# Altium footprint library RES_TH.PcbLib: 94 footprints (part 4 of 6)
Each footprint in its own frame and in the unit in brackets; x right, y up, seen from the top. Pads: shape width x height; smd on the part's side, far side on the other; paste and mask are expansions set on the pad; w line width, h text height; cw(c..) or ccw(c..) is an arc to the next point about the centre after c.
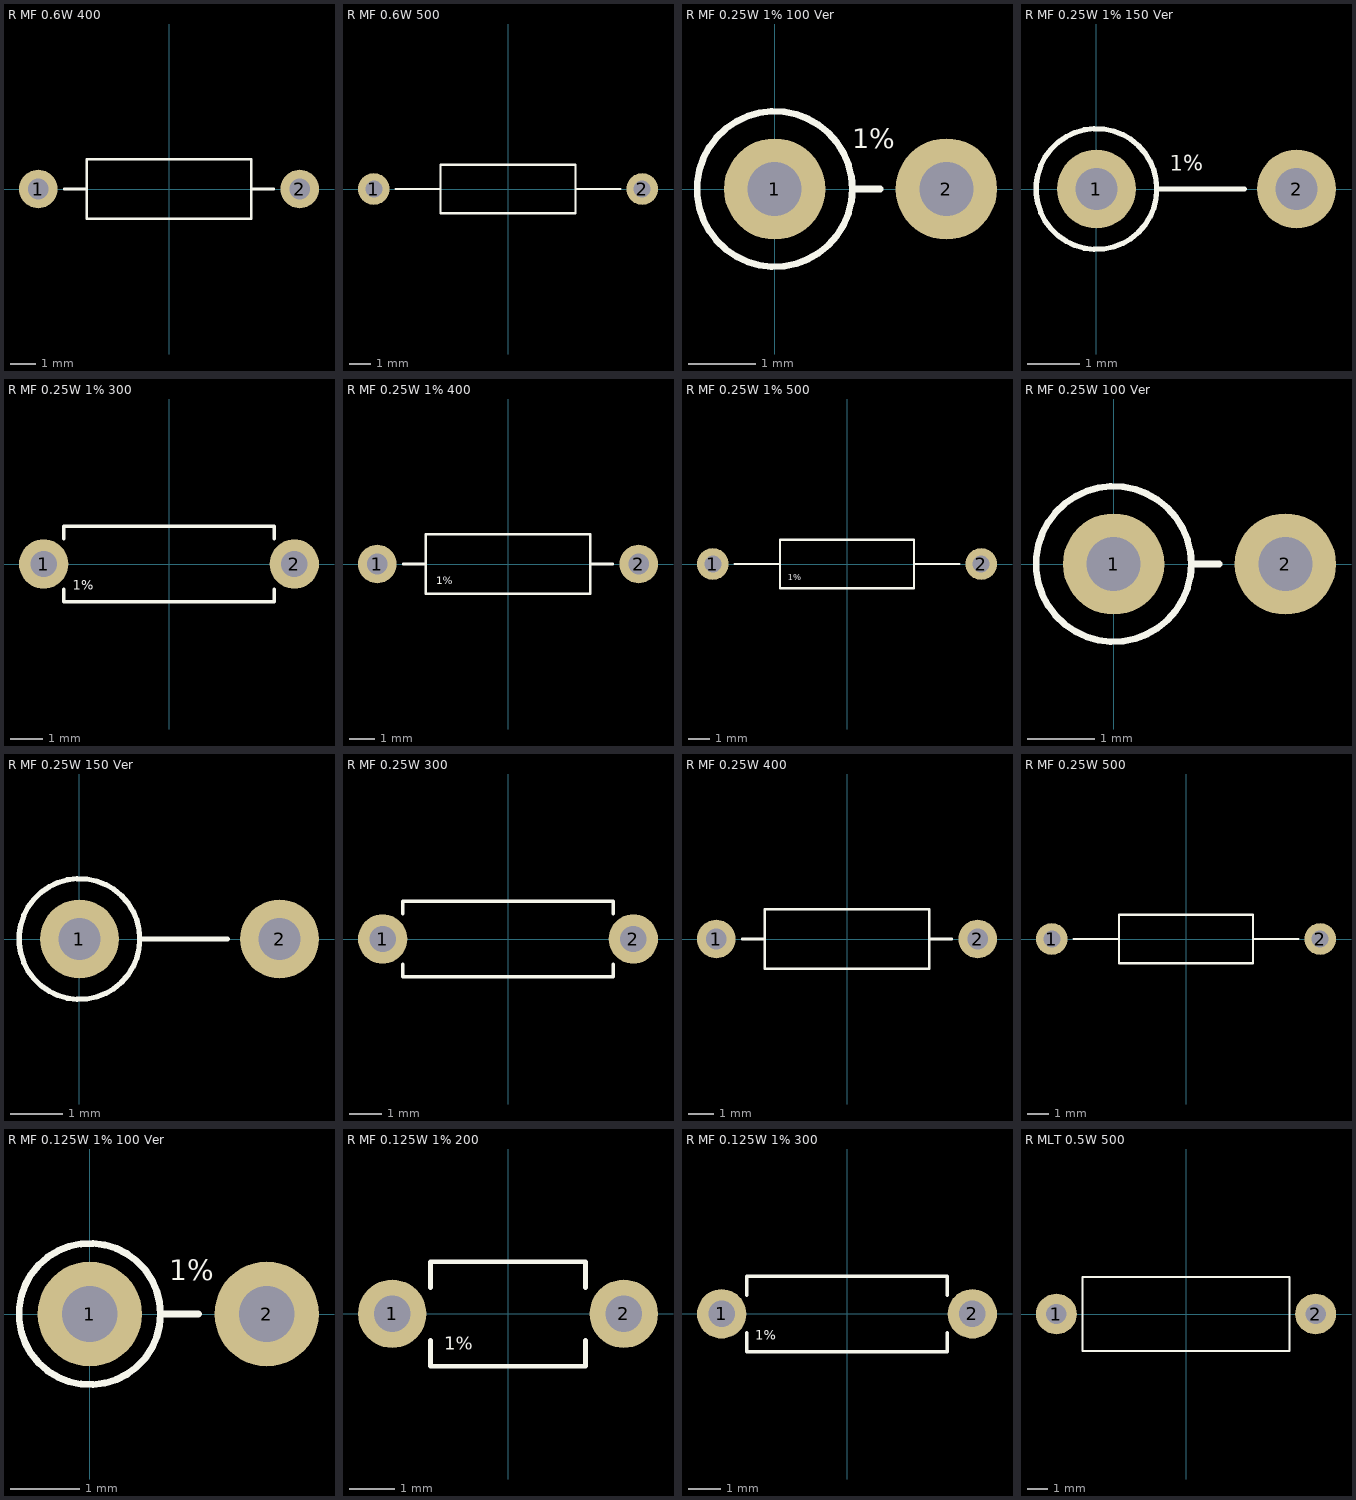
[diagram p3: the footprints below, top view; thin cyan lines are the x and y axes]

## R MF 0.6W 400 [mm]
pads (2):
  round 1.5 hole 0.8: 1(-5.08,0) 2(5.08,0)
Top Overlay:
  lines w0.1: -4.064,0 -3.2,0 ; 3.2,0 4.064,0 ; -3.2,-1.15 3.2,-1.15 3.2,1.15 -3.2,1.15 -3.2,-1.15
3D body "R0.6W 1% 400.SLDPRT": height 2.3, standoff -2.54, extent -5.378,-1.15 5.378,1.15

## R MF 0.6W 500 [mm]
pads (2):
  round 1.5 hole 0.8: 1(-6.35,0) 2(6.35,0)
Top Overlay:
  lines w0.1: -5.334,0 -3.2,0 ; 3.2,0 5.334,0 ; -3.2,-1.15 -3.2,1.15 3.2,1.15 3.2,-1.15 -3.2,-1.15
3D body "R0.6W 1% 500.SLDPRT": height 2.3, standoff -2.54, extent -6.648,-1.15 6.648,1.15

## R MF 0.25W 1% 100 Ver [mm]
pads (2):
  round 1.5 hole 0.8: 1(0,0) 2(2.54,0)
Top Overlay:
  circle w0.1: c0,0 r1.15
  lines w0.1: 1.15,0 1.562,0
  text "1%" at 1.15,0.508 h0.5
3D body "R0.25W 1% 100 Ver.SLDPRT": height 8.06, standoff -2.54, extent -1.15,-1.15 2.838,1.15

## R MF 0.25W 1% 150 Ver [mm]
pads (2):
  round 1.5 hole 0.8: 1(0,0) 2(3.81,0)
Top Overlay:
  circle w0.1: c0,0 r1.15
  lines w0.1: 1.15,0 2.812,0
  text "1%" at 1.397,0.254 h0.5
3D body "R0.25W 1% 150 Ver.SLDPRT": height 8.7, standoff -2.54, extent -1.15,-1.15 4.108,1.15

## R MF 0.25W 1% 300 [mm]
pads (2):
  round 1.5 hole 0.8: 1(-3.81,0) 2(3.81,0)
Top Overlay:
  lines w0.1: -3.2,-0.762 -3.2,-1.15 3.2,-1.15 3.2,-0.762 ; -3.2,0.762 -3.2,1.15 3.2,1.15 3.2,0.762
  text "1%" at -2.921,-0.889 h0.5
3D body "R0.25W 1% 300.SLDPRT": height 2.3, standoff -2.54, extent -4.108,-1.15 4.108,1.15

## R MF 0.25W 1% 400 [mm]
pads (2):
  round 1.5 hole 0.8: 1(-5.08,0) 2(5.08,0)
Top Overlay:
  lines w0.1: -4.064,0 -3.2,0 ; 3.2,0 4.064,0 ; -3.2,-1.15 3.2,-1.15 3.2,1.15 -3.2,1.15 -3.2,-1.15
  text "1%" at -2.794,-0.889 h0.5
3D body "R0.25W 1% 400.SLDPRT": height 2.3, standoff -2.54, extent -5.378,-1.15 5.378,1.15

## R MF 0.25W 1% 500 [mm]
pads (2):
  round 1.5 hole 0.8: 1(-6.35,0) 2(6.35,0)
Top Overlay:
  lines w0.1: -5.334,0 -3.175,0 ; 3.2,0 5.334,0 ; -3.175,-1.15 -3.175,1.15 3.175,1.15 3.175,-1.15 -3.175,-1.15
  text "1%" at -2.794,-0.889 h0.5
3D body "R0.25W 1% 500.SLDPRT": height 2.3, standoff -2.54, extent -6.648,-1.15 6.648,1.15

## R MF 0.25W 100 Ver [mm]
pads (2):
  round 1.5 hole 0.8: 1(0,0) 2(2.54,0)
Top Overlay:
  circle w0.1: c0,0 r1.15
  lines w0.1: 1.15,0 1.562,0
3D body "R0.25W 1% 100 Ver.SLDPRT": height 8.06, standoff -2.54, extent -1.15,-1.15 2.838,1.15

## R MF 0.25W 150 Ver [mm]
pads (2):
  round 1.5 hole 0.8: 1(0,0) 2(3.81,0)
Top Overlay:
  circle w0.1: c0,0 r1.15
  lines w0.1: 1.15,0 2.812,0
3D body "R0.25W 1% 150 Ver.SLDPRT": height 8.7, standoff -2.54, extent -1.15,-1.15 4.108,1.15

## R MF 0.25W 300 [mm]
pads (2):
  round 1.5 hole 0.8: 1(-3.81,0) 2(3.81,0)
Top Overlay:
  lines w0.1: -3.2,-0.762 -3.2,-1.15 3.2,-1.15 3.2,-0.762 ; -3.2,0.762 -3.2,1.15 3.2,1.15 3.2,0.762
3D body "R0.25W 1% 300.SLDPRT": height 2.3, standoff -2.54, extent -4.108,-1.15 4.108,1.15

## R MF 0.25W 400 [mm]
pads (2):
  round 1.5 hole 0.8: 1(-5.08,0) 2(5.08,0)
Top Overlay:
  lines w0.1: -4.064,0 -3.2,0 ; 3.2,0 4.064,0 ; -3.2,-1.15 -3.2,1.15 3.2,1.15 3.2,-1.15 -3.2,-1.15
3D body "R0.25W 1% 400.SLDPRT": height 2.3, standoff -2.54, extent -5.378,-1.15 5.378,1.15

## R MF 0.25W 500 [mm]
pads (2):
  round 1.5 hole 0.8: 1(-6.35,0) 2(6.35,0)
Top Overlay:
  lines w0.1: -5.334,0 -3.175,0 ; 3.2,0 5.334,0 ; -3.175,-1.15 3.175,-1.15 3.175,1.15 -3.175,1.15 -3.175,-1.15
3D body "R0.25W 1% 500.SLDPRT": height 2.3, standoff -2.54, extent -6.648,-1.15 6.648,1.15

## R MF 0.125W 1% 100 Ver [mm]
pads (2):
  round 1.5 hole 0.8: 1(0,0) 2(2.54,0)
Top Overlay:
  circle w0.1: c0,0 r1.016
  lines w0.1: 1.016,0 1.562,0
  text "1%" at 1.143,0.381 h0.5
3D body "R0.125W 1% 100 Ver.SLDPRT": height 6.06, standoff -2.54, extent -1.141,-1.148 2.838,1.148

## R MF 0.125W 1% 200 [mm]
pads (2):
  round 1.5 hole 0.8: 1(-2.54,0) 2(2.54,0)
Top Overlay:
  lines w0.1: -1.7,-0.577 -1.7,-1.15 1.7,-1.15 1.7,-0.577 ; -1.7,0.568 -1.7,1.141 1.7,1.141 1.7,0.568
  text "1%" at -1.397,-0.889 h0.5
3D body "R0.125W 1% 200.STEP": height 2.3, standoff -2.5, extent -2.84,-1.15 2.84,1.15

## R MF 0.125W 1% 300 [mm]
pads (2):
  round 1.5 hole 0.8: 1(-3.81,0) 2(3.81,0)
Top Overlay:
  lines w0.1: -3.048,-0.577 -3.048,-1.15 3.048,-1.15 3.048,-0.577 ; -3.048,0.568 -3.048,1.141 3.048,1.141 3.048,0.568
  text "1%" at -2.794,-0.889 h0.5
3D body "R0.125W 1% 300.STEP": height 2.3, standoff -2.5, extent -4.11,-1.15 4.11,1.15

## R MLT 0.5W 500 [mm]
pads (2):
  round 2 hole 1: 1(-6.35,0) 2(6.35,0)
Top Overlay:
  lines w0.1: -5.08,-1.82 5.08,-1.82 5.08,1.82 -5.08,1.82 -5.08,-1.82
3D body "R0.5W MLT 500.SLDPRT": height 3.8, standoff -2, extent -6.65,-1.9 6.65,1.9